# Altium footprint library LukaLIBRARY.PcbLib: 784 footprints (part 9 of 49)
Each footprint in its own frame and in the unit in brackets; x right, y up, seen from the top. Pads: shape width x height; smd on the part's side, far side on the other; paste and mask are expansions set on the pad; w line width, h text height; cw(c..) or ccw(c..) is an arc to the next point about the centre after c.
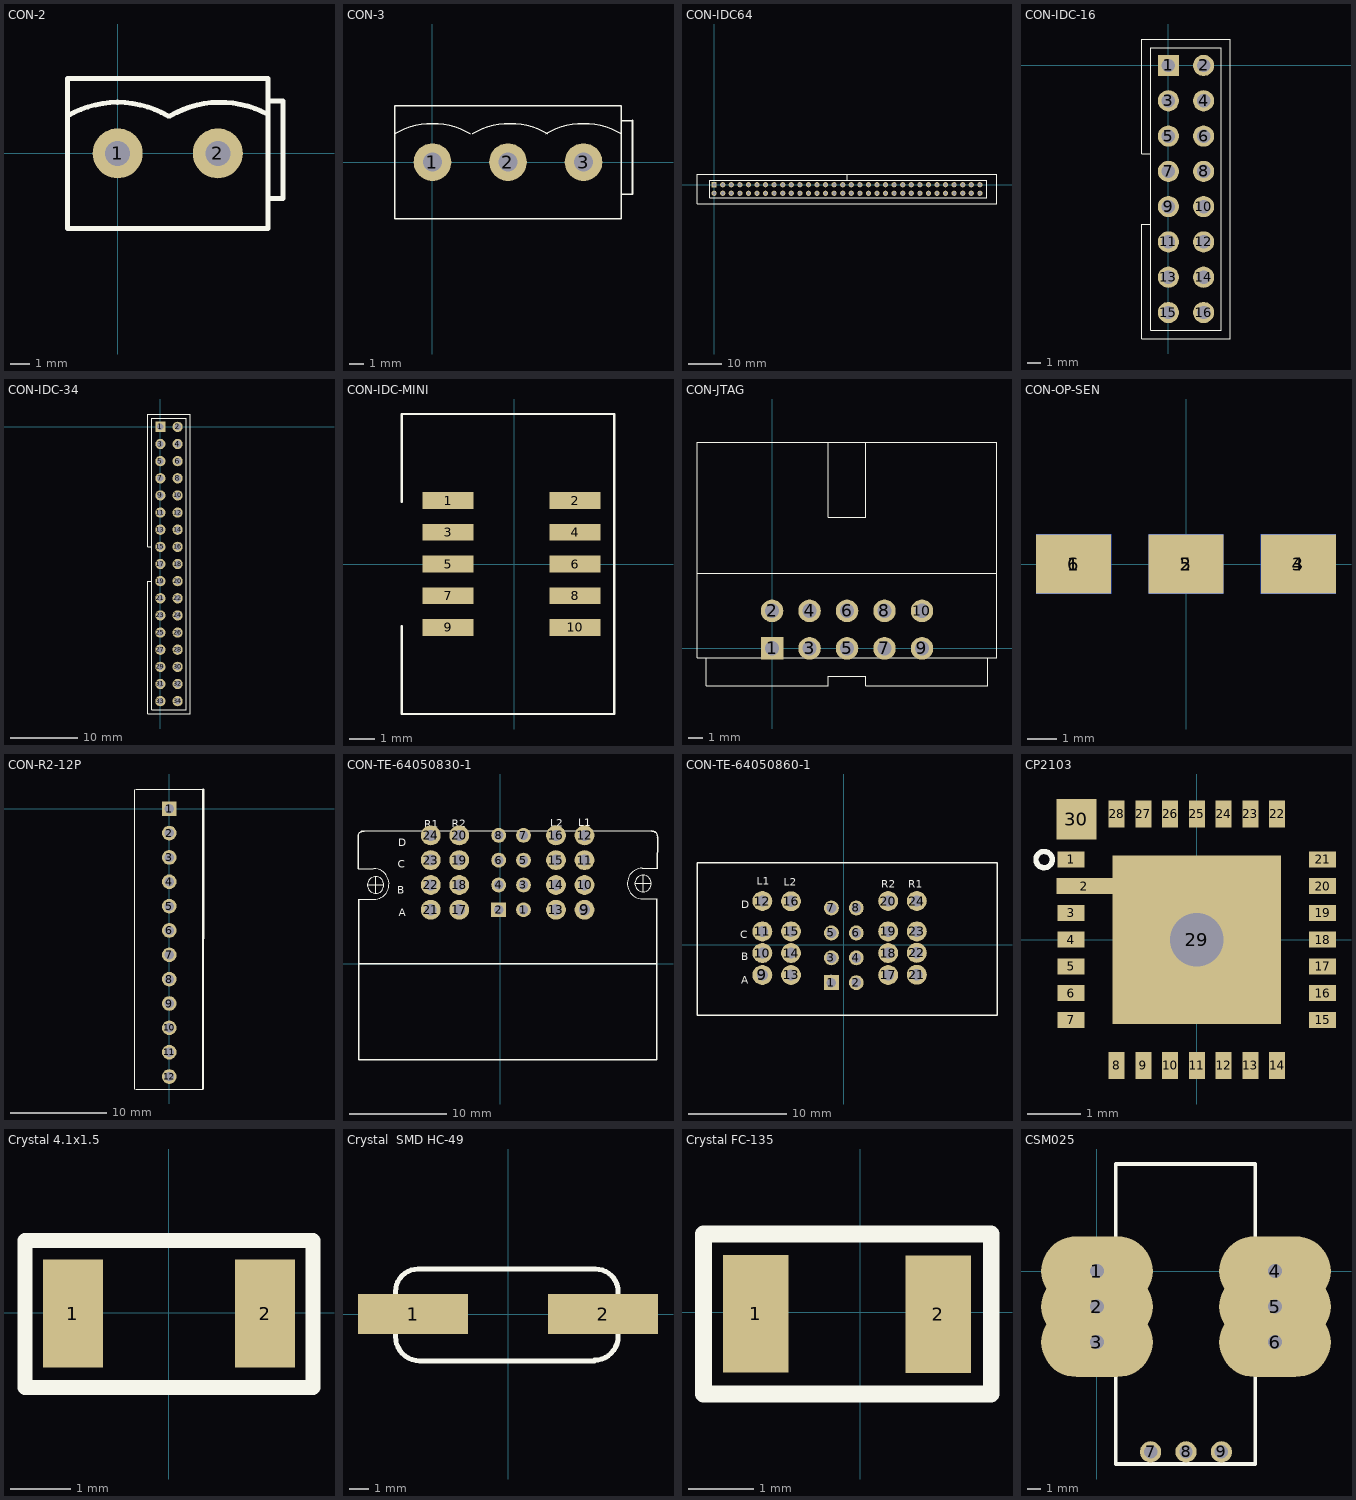
[diagram p8: the footprints below, top view; thin cyan lines are the x and y axes]

## CON-2 [mm]
pads (2):
  round 2.54 hole 1.27: 1(0,0) 2(5.08,0)
Top Overlay:
  lines w0.254: -2.543,1.903 cw(c0,-2.413) 2.543,1.903 ; 2.664,1.903 cw(c5.207,-2.413) 7.608,1.984 ; 7.62,-2.286 8.382,-2.286 8.382,2.667 7.62,2.667 ; -2.54,-3.81 7.62,-3.81 7.62,3.81 -2.54,3.81 -2.54,-3.81

## CON-3 [mm]
pads (3):
  round 2.54 hole 1.27 mask-25.4: 1(0,0) 2(5.08,0) 3(10.16,0)
Top Overlay:
  lines w0.1: -2.543,1.903 cw(c0,-2.413) 2.543,1.903 ; 2.664,1.903 cw(c5.207,-2.413) 7.75,1.903 ; 7.617,1.903 cw(c10.16,-2.413) 12.703,1.903 ; 12.7,-2.159 13.462,-2.159 ; 12.7,2.794 13.462,2.794 ; -2.54,-3.81 -2.54,3.81 12.7,3.81 12.7,-3.81 -2.54,-3.81
  lines w0.127: 13.462,-2.159 13.462,2.794
Top Solder:
  region: 0,1.281 -0.332,1.237 -0.64,1.109 -0.906,0.906 -1.109,0.64 -1.237,0.332 -1.281,0 -1.237,-0.332 -1.109,-0.64 -0.906,-0.906 -0.64,-1.109 -0.332,-1.237 0,-1.281 0.332,-1.237 0.64,-1.109 0.906,-0.906 1.109,-0.64 1.237,-0.332 1.281,0 1.237,0.332 1.109,0.64 0.906,0.906 0.64,1.109 0.332,1.237
  region: 10.16,1.281 9.828,1.237 9.52,1.109 9.254,0.906 9.051,0.64 8.923,0.332 8.879,0 8.923,-0.332 9.051,-0.64 9.254,-0.906 9.52,-1.109 9.828,-1.237 10.16,-1.281 10.492,-1.237 10.8,-1.109 11.066,-0.906 11.269,-0.64 11.397,-0.332 11.441,0 11.397,0.332 11.269,0.64 11.066,0.906 10.8,1.109 10.492,1.237
  region: 5.08,1.281 4.748,1.237 4.44,1.109 4.174,0.906 3.971,0.64 3.843,0.332 3.799,0 3.843,-0.332 3.971,-0.64 4.174,-0.906 4.44,-1.109 4.748,-1.237 5.08,-1.281 5.412,-1.237 5.72,-1.109 5.986,-0.906 6.189,-0.64 6.317,-0.332 6.361,0 6.317,0.332 6.189,0.64 5.986,0.906 5.72,1.109 5.412,1.237
Bottom Solder:
  region: 0,1.281 -0.332,1.237 -0.64,1.109 -0.906,0.906 -1.109,0.64 -1.237,0.332 -1.281,0 -1.237,-0.332 -1.109,-0.64 -0.906,-0.906 -0.64,-1.109 -0.332,-1.237 0,-1.281 0.332,-1.237 0.64,-1.109 0.906,-0.906 1.109,-0.64 1.237,-0.332 1.281,0 1.237,0.332 1.109,0.64 0.906,0.906 0.64,1.109 0.332,1.237
  region: 10.16,1.281 9.828,1.237 9.52,1.109 9.254,0.906 9.051,0.64 8.923,0.332 8.879,0 8.923,-0.332 9.051,-0.64 9.254,-0.906 9.52,-1.109 9.828,-1.237 10.16,-1.281 10.492,-1.237 10.8,-1.109 11.066,-0.906 11.269,-0.64 11.397,-0.332 11.441,0 11.397,0.332 11.269,0.64 11.066,0.906 10.8,1.109 10.492,1.237
  region: 5.08,1.281 4.748,1.237 4.44,1.109 4.174,0.906 3.971,0.64 3.843,0.332 3.799,0 3.843,-0.332 3.971,-0.64 4.174,-0.906 4.44,-1.109 4.748,-1.237 5.08,-1.281 5.412,-1.237 5.72,-1.109 5.986,-0.906 6.189,-0.64 6.317,-0.332 6.361,0 6.317,0.332 6.189,0.64 5.986,0.906 5.72,1.109 5.412,1.237

## CON-IDC64 [mil]
pads (64):
  rect 60x60 hole 38 mask-1000: 1(0,0)
  round 60 hole 38 mask-1000: 2(0,-100) 3(100,0) 4(100,-100) 5(200,0) 6(200,-100) 7(300,0) 8(300,-100) 9(400,0) 10(400,-100) 11(500,0) 12(500,-100) 13(600,0) 14(600,-100) 15(700,0) 16(700,-100) 17(800,0) 18(800,-100) 19(900,0) 20(900,-100) 21(1000,0) 22(1000,-100) 23(1100,0) 24(1100,-100) 25(1200,0) 26(1200,-100) 27(1300,0) 28(1300,-100) 29(1400,0) 30(1400,-100) 31(1500,0) 32(1500,-100) 33(1600,0) 34(1600,-100) 35(1700,0) 36(1700,-100) 37(1800,0) 38(1800,-100) 39(1900,0) 40(1900,-100) 41(2000,0) 42(2000,-100) 43(2100,0) 44(2100,-100) 45(2200,0) 46(2200,-100) 47(2300,0) 48(2300,-100) 49(2400,0) 50(2400,-100) 51(2500,0) 52(2500,-100) 53(2600,0) 54(2600,-100) 55(2700,0) 56(2700,-100) 57(2800,0) 58(2800,-100) 59(2900,0) 60(2900,-100) 61(3000,0) 62(3000,-100) 63(3100,0) 64(3100,-100)
Top Overlay:
  lines w0.39: 1550,50 1550,120 ; 3000,120 3150,120 ; 3100,-220 3160,-220 ; 3300,0 3300,120 ; 3300,120 -200,120 -200,-50 -200,-220 3300,-220 3300,120
  lines w1: -50,-150 3180,-150 3180,50 -50,50 -50,-150
Top Solder:
  drawing of 64 lines, arcs and shapes, not listed
Bottom Solder:
  drawing of 64 lines, arcs and shapes, not listed

## CON-IDC-16 [mil]
pads (16):
  rect 60x60 hole 38 mask-1000: 1(0,0)
  round 60 hole 38 mask-1000: 2(100,0) 3(0,-100) 4(100,-100) 5(0,-200) 6(100,-200) 7(0,-300) 8(100,-300) 9(0,-400) 10(100,-400) 11(0,-500) 12(100,-500) 13(0,-600) 14(100,-600) 15(0,-700) 16(100,-700)
Top Overlay:
  lines w1: -50,-750 -50,50 150,50 150,-750 -50,-750
  lines w3: -50,-450 -75,-450 -75,-775 175,-775 175,75 -75,75 -75,-250 -50,-250
Top Solder:
  drawing of 16 lines, arcs and shapes, not listed
Bottom Solder:
  drawing of 16 lines, arcs and shapes, not listed

## CON-IDC-34 [mil]
pads (34):
  rect 60x60 hole 38 mask-1000: 1(0,0)
  round 60 hole 38 mask-1000: 2(100,0) 3(0,-100) 4(100,-100) 5(0,-200) 6(100,-200) 7(0,-300) 8(100,-300) 9(0,-400) 10(100,-400) 11(0,-500) 12(100,-500) 13(0,-600) 14(100,-600) 15(0,-700) 16(100,-700) 17(0,-800) 18(100,-800) 19(0,-900) 20(100,-900) 21(0,-1000) 22(100,-1000) 23(0,-1100) 24(100,-1100) 25(0,-1200) 26(100,-1200) 27(0,-1300) 28(100,-1300) 29(0,-1400) 30(100,-1400) 31(0,-1500) 32(100,-1500) 33(0,-1600) 34(100,-1600)
Top Overlay:
  lines w1: -50,-1650 -50,50 150,50 150,-1650 -50,-1650
  lines w3: -50,-900 -75,-900 -75,-1675 175,-1675 175,75 -75,75 -75,-700 -50,-700
Top Solder:
  drawing of 34 lines, arcs and shapes, not listed
Bottom Solder:
  drawing of 34 lines, arcs and shapes, not listed

## CON-IDC-MINI [mil]
pads (10):
  rect 80x26 smd mask-1000: 1(-104.33,100) 2(95.67,100) 3(-104.33,50) 4(95.67,50) 5(-104.33,0) 6(95.67,0) 7(-104.33,-50) 8(95.67,-50) 9(-104.33,-100) 10(95.67,-100)
Top Overlay:
  lines w3.94: -177.17,-98.43 -177.17,-236.22 157.48,-236.22 157.48,236.22 -177.17,236.22 -177.17,98.43
Top Solder:
  region: 55.67,-13 135.67,-13 135.67,13 55.67,13
  region: -144.33,-13 -64.33,-13 -64.33,13 -144.33,13
  region: 55.67,37 135.67,37 135.67,63 55.67,63
  region: 55.67,87 135.67,87 135.67,113 55.67,113
  region: 55.67,-113 135.67,-113 135.67,-87 55.67,-87
  region: 55.67,-63 135.67,-63 135.67,-37 55.67,-37
  region: -144.33,37 -64.33,37 -64.33,63 -144.33,63
  region: -144.33,87 -64.33,87 -64.33,113 -144.33,113
  region: -144.33,-113 -64.33,-113 -64.33,-87 -144.33,-87
  region: -144.33,-63 -64.33,-63 -64.33,-37 -144.33,-37

## CON-JTAG [mil]
pads (10):
  rect 60x60 hole 38 mask-1000: 1(0,0)
  round 60 hole 38 mask-1000: 2(0,100) 3(100,0) 4(100,100) 5(200,0) 6(200,100) 7(300,0) 8(300,100) 9(400,0) 10(400,100)
Top Overlay:
  lines w3: -200,200 600,200 ; -175,-25 -175,-100 150,-100 150,-75 250,-75 250,-100 575,-100 575,-25 ; 150,550 150,350 250,350 250,550 ; -200,-25 600,-25 600,550 -200,550 -200,-25
Top Solder:
  drawing of 10 lines, arcs and shapes, not listed
Bottom Solder:
  drawing of 10 lines, arcs and shapes, not listed

## CON-OP-SEN [mm]
pads (6):
  rect 2.54x2 smd mask-25.4: 1(-3.81,0) 2(0,0) 3(3.81,0)
  rect 2.54x2 smd far side mask-25.4: 4(3.81,0) 5(0,0) 6(-3.81,0)
Top Solder:
  region: -5.08,-1 -2.54,-1 -2.54,1 -5.08,1
  region: 2.54,-1 5.08,-1 5.08,1 2.54,1
  region: -1.27,-1 1.27,-1 1.27,1 -1.27,1
Bottom Solder:
  region: -5.08,-1 -2.54,-1 -2.54,1 -5.08,1
  region: 2.54,-1 5.08,-1 5.08,1 2.54,1
  region: -1.27,-1 1.27,-1 1.27,1 -1.27,1

## CON-R2-12P [mil]
pads (12):
  rect 60x60 hole 38 mask-1000: 1(0,0)
  round 60 hole 38 mask-1000: 2(0,-100) 3(0,-200) 4(0,-300) 5(0,-400) 6(0,-500) 7(0,-600) 8(0,-700) 9(0,-800) 10(0,-900) 11(0,-1000) 12(0,-1100)
Top Overlay:
  lines w3.94: -140.94,-1151.18 -140.79,78.94 ; -137.01,-1151.18 138.58,-1151.18 ; -137.01,81.1 138.58,81.1
  lines w10: 138.58,-1147.24 138.74,78.94
Top Solder:
  drawing of 12 lines, arcs and shapes, not listed
Bottom Solder:
  drawing of 12 lines, arcs and shapes, not listed

## CON-TE-64050830-1 [mil]
pads (24):
  round 60 hole 38 mask-1000: 1(94,218) 3(94,318) 4(-6,318) 5(94,418) 6(-6,418) 7(94,518) 8(-6,518)
  rect 60x60 hole 38 mask-1000: 2(-6,218)
  round 80 hole 45 mask-1000: 9(340,218) 10(340,318) 11(340,418) 12(340,518) 13(225,218) 14(225,318) 15(225,418) 16(225,518) 17(-165,218) 18(-165,318) 19(-165,418) 20(-165,518) 21(-279.72,218.03) 22(-279.72,318.03) 23(-279.72,418.03) 24(-279.72,518.03)
Top Overlay:
  circle w0.39: c-502,318 r33.38
  circle w0.39: c576,324 r33.38
  lines w0.39: -535,318 -469,318 ; -502,285 -502,351 ; 543,324 609,324 ; 576,291 576,357
  lines w5: -573.12,383.86 -512.09,383.86 ; -570.12,259.84 -509.09,259.84 ; -511.06,259.84 ccw(c-510.08,321.85) -509.09,383.86 ; 573.28,261.81 632,262 ; 575.25,261.81 cw(c574.27,323.82) 573.28,385.83 634.31,385.83
  lines w5.12: -573.12,383.86 -573.12,511.81 ; -573.02,508.88 cw(c-549.5,511.81) -549.5,535.51 ; -571.12,-385.83 -571.12,259.84 ; -571,-386 631,-386 ; -571,0 632,0 ; -547.43,535.43 610,536 ; 610.68,535.51 cw(c610.68,511.81) 634.21,508.88 ; 631.31,-385.83 631.31,261.81 ; 634,386 634.31,511.81
  text "A" at -409,191 h31.25
  text "B" at -414,282 h31.25
  text "D" at -411,475 h31.25
  text "R2" at -196,550 h31.25
  text "L2" at 201,553 h31.25
  text "L1" at 314,555 h31.25
  text "C" at -413,388 h31.25
  text "R1" at -307,549 h31.25
Top Solder:
  drawing of 24 lines, arcs and shapes, not listed
Bottom Solder:
  drawing of 24 lines, arcs and shapes, not listed

## CON-TE-64050860-1 [mil]
pads (24):
  rect 60x60 hole 38 mask-1000: 1(-50,-152)
  round 60 hole 40 mask-1000: 2(50,-152) 3(-50,-52) 4(50,-52) 5(-50,48) 6(50,48) 7(-50,148) 8(50,148)
  round 80 hole 45 mask-1000: 9(-327,-121) 10(-327,-33) 11(-327,54) 12(-327,176) 13(-212,-121) 14(-212,-33) 15(-212,54) 16(-212,175) 17(178,-121) 18(178,-33) 19(178,54) 20(178,176) 21(293,-120) 22(293,-32) 23(293,54) 24(293,176)
Top Overlay:
  lines w0.39: -50,-152 -50,-120 ; 49,-282 88,-282 ; 293,149 293,157
  lines w5.12: -589.39,-281.86 -589,329 615,329 615,-282 -589,-282
  text "R1" at 259,230 h31.25
  text "L1" at -350,241 h31.25
  text "R2" at 151,230 h31.25
  text "L2" at -242,238 h31.25
  text "B" at -412,-61 h31.25
  text "C" at -415,27 h31.25
  text "D" at -412,147 h31.25
  text "A" at -412,-157 h31.25
Top Solder:
  drawing of 24 lines, arcs and shapes, not listed
Bottom Solder:
  drawing of 24 lines, arcs and shapes, not listed

## CP2103 [mm]
pads (30):
  rect 0.5x0.3 smd mask-25.4: 1(-2.35,1.5) 3(-2.35,0.5) 4(-2.35,0) 5(-2.35,-0.5) 6(-2.35,-1) 7(-2.35,-1.5) 15(2.35,-1.5) 16(2.35,-1) 17(2.35,-0.5) 18(2.35,0) 19(2.35,0.5) 20(2.35,1) 21(2.35,1.5)
  rect 1.05x0.3 smd mask-25.4: 2(-2.1,1)
  rect 0.3x0.5 smd mask-25.4: 8(-1.5,-2.35) 9(-1,-2.35) 10(-0.5,-2.35) 11(0,-2.35) 12(0.5,-2.35) 13(1,-2.35) 14(1.5,-2.35) 22(1.5,2.35) 23(1,2.35) 24(0.5,2.35) 25(0,2.35) 26(-0.5,2.35) 27(-1,2.35) 28(-1.5,2.35)
  rect 3.15x3.15 hole 1 unplated mask-25.4: 29(0,0)
  rect 0.75x0.75 smd mask-25.4: 30(-2.25,2.25)
Top Overlay:
  circle w0.1: c-2.853,1.496 r0.152
Top Solder:
  region: -1.575,-1.575 1.575,-1.575 1.575,1.575 -1.575,1.575
  region: 2.1,-1.15 2.6,-1.15 2.6,-0.85 2.1,-0.85
  region: 2.1,-0.65 2.6,-0.65 2.6,-0.35 2.1,-0.35
  region: 2.1,-0.15 2.6,-0.15 2.6,0.15 2.1,0.15
  region: 2.1,0.35 2.6,0.35 2.6,0.65 2.1,0.65
  region: 2.1,0.85 2.6,0.85 2.6,1.15 2.1,1.15
  region: 2.1,-1.65 2.6,-1.65 2.6,-1.35 2.1,-1.35
  region: 2.1,1.35 2.6,1.35 2.6,1.65 2.1,1.65
  region: -2.6,1.35 -2.1,1.35 -2.1,1.65 -2.6,1.65
  region: -2.6,0.35 -2.1,0.35 -2.1,0.65 -2.6,0.65
  region: -2.6,-0.15 -2.1,-0.15 -2.1,0.15 -2.6,0.15
  region: -2.6,-0.65 -2.1,-0.65 -2.1,-0.35 -2.6,-0.35
  region: -2.6,-1.15 -2.1,-1.15 -2.1,-0.85 -2.6,-0.85
  region: -2.6,-1.65 -2.1,-1.65 -2.1,-1.35 -2.6,-1.35
  region: -0.85,-2.6 -0.85,-2.1 -1.15,-2.1 -1.15,-2.6
  region: -0.35,-2.6 -0.35,-2.1 -0.65,-2.1 -0.65,-2.6
  region: 0.15,-2.6 0.15,-2.1 -0.15,-2.1 -0.15,-2.6
  region: 0.65,-2.6 0.65,-2.1 0.35,-2.1 0.35,-2.6
  region: 1.15,-2.6 1.15,-2.1 0.85,-2.1 0.85,-2.6
  region: 1.65,-2.6 1.65,-2.1 1.35,-2.1 1.35,-2.6
  region: -1.35,-2.6 -1.35,-2.1 -1.65,-2.1 -1.65,-2.6
  region: 1.65,2.1 1.65,2.6 1.35,2.6 1.35,2.1
  region: 1.15,2.1 1.15,2.6 0.85,2.6 0.85,2.1
  region: 0.65,2.1 0.65,2.6 0.35,2.6 0.35,2.1
  region: 0.15,2.1 0.15,2.6 -0.15,2.6 -0.15,2.1
  region: -0.35,2.1 -0.35,2.6 -0.65,2.6 -0.65,2.1
  region: -0.85,2.1 -0.85,2.6 -1.15,2.6 -1.15,2.1
  region: -1.35,2.1 -1.35,2.6 -1.65,2.6 -1.65,2.1
  region: -2.625,0.85 -1.575,0.85 -1.575,1.15 -2.625,1.15
  region: -2.625,1.875 -1.875,1.875 -1.875,2.625 -2.625,2.625
Bottom Solder:
  region: -1.575,-1.575 1.575,-1.575 1.575,1.575 -1.575,1.575

## Crystal 4.1x1.5 [mm] "Crystal 4.1x1.5"
pads (2):
  rect 1x1.8 smd: 1(-1.6,-0.02) 2(1.6,-0.02)
Top Overlay:
  lines w0.254: -2.4,-1.25 2.4,-1.25 2.4,1.2 -2.4,1.2 -2.4,-1.25

## Crystal  SMD HC-49 [mil]
pads (2):
  rect 220x80 smd: 1(-190,0) 2(190,0)
Top Overlay:
  lines w10: 172.9,-93.61 -176.67,-93.61 cw(c-176.67,-45.28) -225,-45.28 -225,45 cw(c-180,45) -180,90 175,90 cw(c175,44.72) 220.28,44.72 220.28,-45 cw(c172.9,-45) 172.9,-92.38

## Crystal FC-135 [mm] "3.2x1.5mm"
pads (2):
  rect 1x1.8 smd: 1(-1.6,-0.02) 2(1.194,-0.025)
Top Overlay:
  lines w0.254: -2.4,-1.25 -2.4,1.2 2.007,1.2 2.007,-1.25 -2.4,-1.25

## CSM025 [mm]
pads (9):
  oval 8x5 hole 1 mask-25.4: 1(0,0) 2(0,-2.54) 3(0,-5.08) 4(12.76,0) 5(12.76,-2.54) 6(12.76,-5.08)
  round 1.524 hole 0.965 mask-25.4: 7(3.84,-12.95) 8(6.38,-12.95) 9(8.92,-12.95)
Top Overlay:
  lines w0.254: 11.24,7.68 1.34,7.68 1.34,-13.82 11.34,-13.82 11.34,7.68
Top Solder:
  drawing of 9 lines, arcs and shapes, not listed
Bottom Solder:
  drawing of 9 lines, arcs and shapes, not listed